# Altium footprint library Sajad_Altium_Library.PcbLib: 333 footprints (part 21 of 21)
Each footprint in its own frame and in the unit in brackets; x right, y up, seen from the top. Pads: shape width x height; smd on the part's side, far side on the other; paste and mask are expansions set on the pad; w line width, h text height; cw(c..) or ccw(c..) is an arc to the next point about the centre after c.
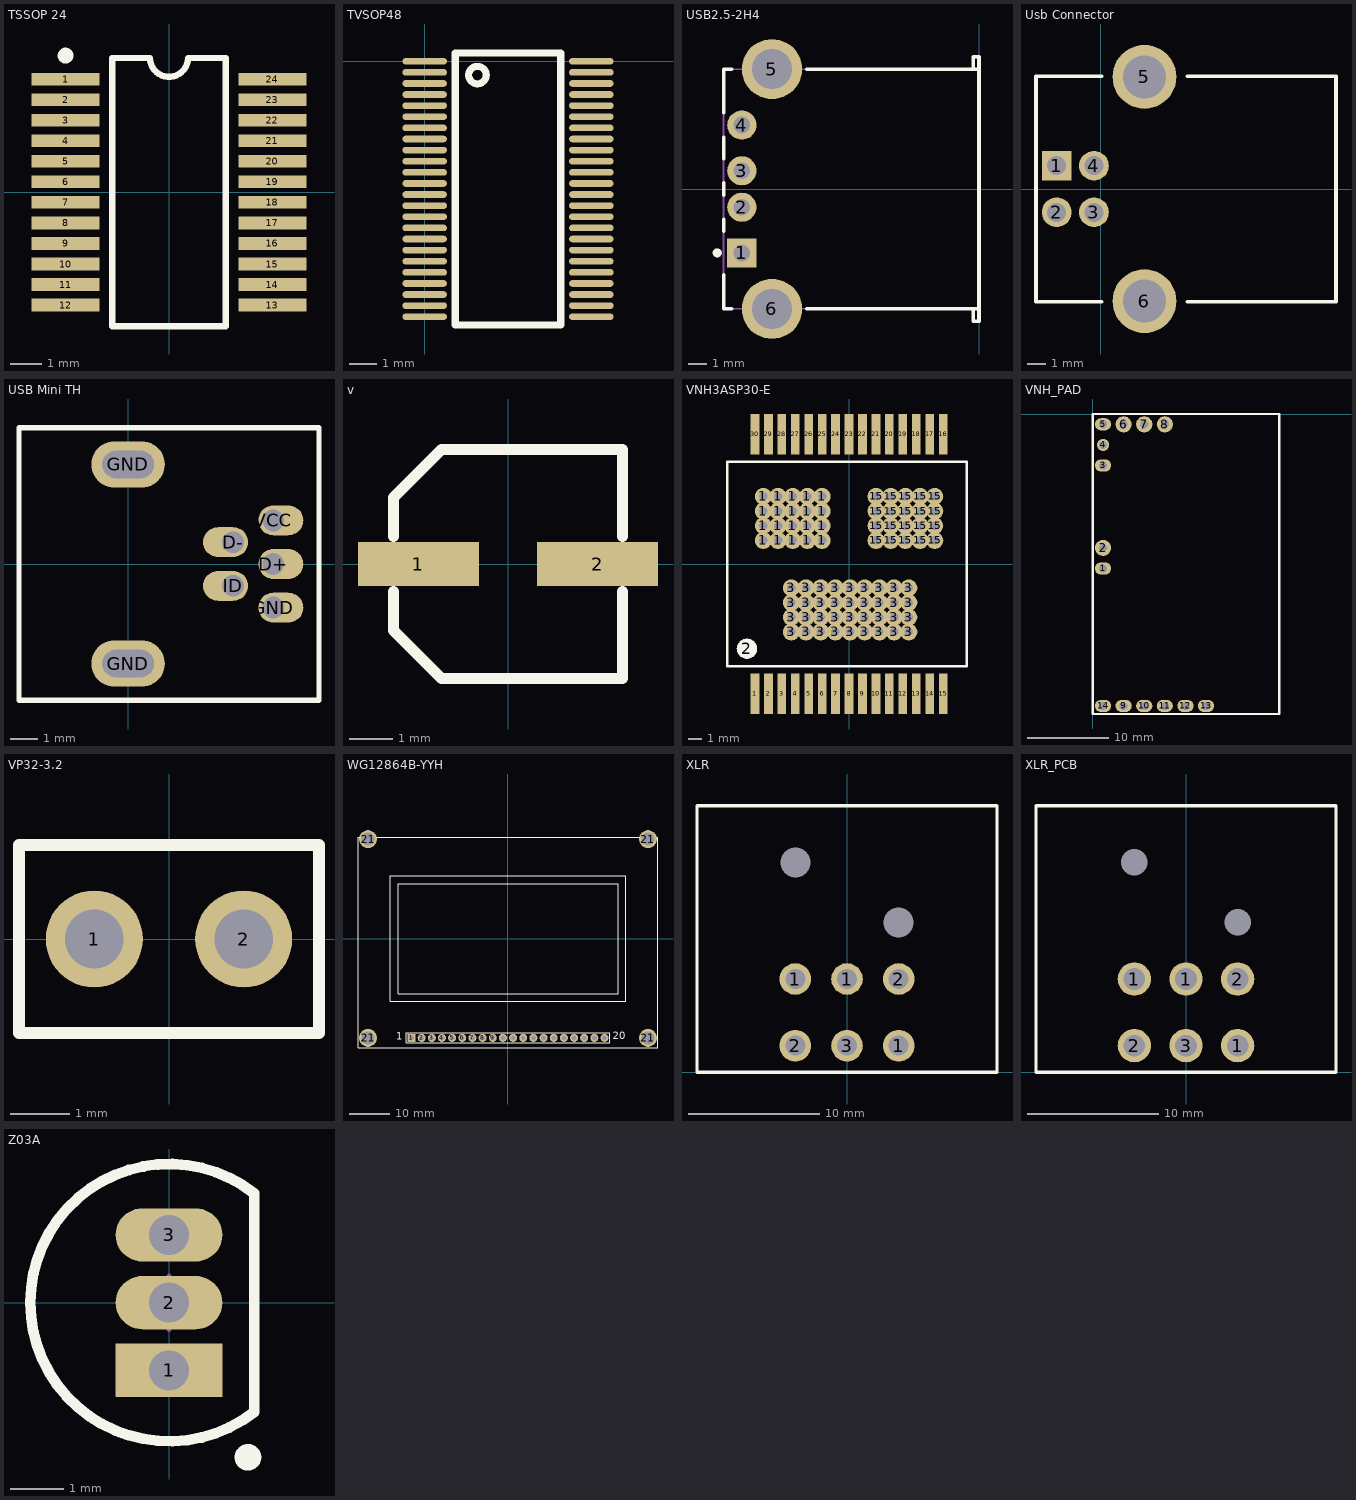
[diagram p20: the footprints below, top view; thin cyan lines are the x and y axes]

## TSSOP 24 [mm] "SSOP, Plastic; 24 Leads; Body Width 5.3 mm; Pitch 0.65 mm"
height 2
pads (24):
  rect 2.15x0.4 smd: 1(-3.275,3.575) 2(-3.275,2.925) 3(-3.275,2.275) 4(-3.275,1.625) 5(-3.275,0.975) 6(-3.275,0.325) 7(-3.275,-0.325) 8(-3.275,-0.975) 9(-3.275,-1.625) 10(-3.275,-2.275) 11(-3.275,-2.925) 12(-3.275,-3.575) 13(3.275,-3.575) 14(3.275,-2.925) 15(3.275,-2.275) 16(3.275,-1.625) 17(3.275,-0.975) 18(3.275,-0.325) 19(3.275,0.325) 20(3.275,0.975) 21(3.275,1.625) 22(3.275,2.275) 23(3.275,2.925) 24(3.275,3.575)
Top Overlay:
  circle w0.25: c-3.275,4.325 r0.125
  lines w0.2: -1.8,-4.25 1.8,-4.25 1.8,4.25 0.6,4.25 cw(c0,4.25) -0.6,4.25 -1.8,4.25 -1.8,-4.25
3D body: height 1.1, standoff 0, extent -3.2,-3.95 3.2,3.95

## TVSOP48 [mm]
pads (48):
  oval 1.6x0.24 smd: 1(0,0) 2(0,-0.4) 3(0,-0.8) 4(0,-1.2) 5(0,-1.6) 6(0,-2) 7(0,-2.4) 8(0,-2.8) 9(0,-3.2) 10(0,-3.6) 11(0,-4) 12(0,-4.4) 13(0,-4.8) 14(0,-5.2) 15(0,-5.6) 16(0,-6) 17(0,-6.4) 18(0,-6.8) 19(0,-7.2) 20(0,-7.6) 21(0,-8) 22(0,-8.4) 23(0,-8.8) 24(0,-9.2) 25(6,-9.2) 26(6,-8.8) 27(6,-8.4) 28(6,-8) 29(6,-7.6) 30(6,-7.2) 31(6,-6.8) 32(6,-6.4) 33(6,-6) 34(6,-5.6) 35(6,-5.2) 36(6,-4.8) 37(6,-4.4) 38(6,-4) 39(6,-3.6) 40(6,-3.2) 41(6,-2.8) 42(6,-2.4) 43(6,-2) 44(6,-1.6) 45(6,-1.2) 46(6,-0.8) 47(6,-0.4) 48(6,0)
Top Overlay:
  circle w0.254: c1.9,-0.5 r0.316
  lines w0.254: 1.1,-9.5 1.1,0.3 4.9,0.3 4.9,-9.5 1.1,-9.5

## USB2.5-2H4 [mm] "Connector; USB1.1, Series A, Reverse Type, Thru-Hole; 4 Position; Right Angle"
height 6.5
pads (6):
  rect 1.6x1.6 hole 0.92: 1(-13,-3.5)
  round 1.6 hole 0.92: 2(-13,-1) 3(-13,1) 4(-13,3.5)
  round 3.3 hole 2.2: 5(-11.348,6.57) 6(-11.348,-6.57)
Top Overlay:
  circle w0.25: c-14.35,-3.5 r0.125
  lines w0.2: -14,-4.7 -14,-6.565 -13.55,-6.565 ; -14,-2.3 -14,-1.67 ; -14,-0.33 -14,0.33 ; -14,1.67 -14,2.83 ; -14,4.17 -14,6.565 -13.55,6.565 ; -9.45,-6.565 0,-6.565 ; -9.45,6.565 0,6.565 ; -0.32,-6.565 -0.32,-7.25 0,-7.25 0,7.25 -0.32,7.25 -0.32,6.565
Mechanical 1:
  lines w0.1: 0,-7.25 0,7.25
  text "PCB Edge" at -0.336,-6.303 h0.25
Mechanical 13:
  lines w0.1: -14,-6.565 -14,6.565 -0.32,6.565 -0.32,7.25 0,7.25 0,-7.25 -0.32,-7.25 -0.32,-6.565 -14,-6.565
3D body: height 6.95, standoff -4.2, extent -14.235,-7.9 -0.535,7.9

## Usb Connector [mm] "Usb Connector"
pads (6):
  rect 1.6x1.6 hole 1.016: 1(-2.355,1.25)
  round 1.6 hole 1.016: 2(-2.355,-1.25) 3(-0.355,-1.25) 4(-0.355,1.25)
  round 3.429 hole 2.3: 5(2.355,6.02) 6(2.355,-6.02)
Top Overlay:
  lines w0.2: 0.055,-6.05 -3.465,-6.05 -3.465,6.05 0.055,6.05 ; 4.655,-6.05 12.635,-6.05 12.635,6.05 4.655,6.05
3D body: height 11.5, standoff -3.14, extent -3.868,-7.399 12.632,7.397

## USB Mini TH [mm] "USB Mini MOLEX 548190519"
height 4
pads (7):
  oval 1.65x1.1 hole 0.8 copper offset 0.275,0: D+(5.325,0) GND(5.325,-1.6) VCC(5.325,1.6)
  oval 1.65x1.1 hole 0.8 copper offset -0.275,0: D-(3.85,0.8) ID(3.85,-0.8)
  oval 2.7x1.7 hole 1 slot 1.9 at 0 deg: GND(0,-3.65) GND(0,3.65)
Top Overlay:
  lines w0.2: -4,-5 7,-5 7,5 -4,5 -4,-5
3D body: height 4, standoff -1.75, extent -3.6,-3.85 5.4,3.85

## v [mm] "5 x 5.5mm Smd Capacitor"
pads (2):
  rect 2.8x1.016 smd: 1(-2.073,0) 2(2.073,0)
Top Overlay:
  lines w0.254: -2.65,-0.635 -2.65,-1.541 -1.541,-2.65 2.65,-2.65 2.65,-0.635 ; -2.65,0.635 -2.65,1.541 -1.541,2.65 2.65,2.65 2.65,0.635
3D body: height 5.41, standoff 0, extent -2.95,-2.65 2.95,2.65

## VNH3ASP30-E [mil]
pads (107):
  rect 25.59x118.11 smd: 1(-275.59,-380.24) 2(-236.22,-380.24) 3(-196.85,-380.24) 4(-157.48,-380.24) 5(-118.11,-380.24) 6(-78.74,-380.24) 7(-39.37,-380.24) 8(0,-380.24) 9(39.37,-380.24) 10(78.74,-380.24) 11(118.11,-380.24) 12(157.48,-380.24) 13(196.85,-380.24) 14(236.22,-380.24) 15(275.59,-380.24) 16(275.59,380.24) 17(236.22,380.24) 18(196.85,380.24) 19(157.48,380.24) 20(118.11,380.24) 21(78.74,380.24) 22(39.37,380.24) 23(0,380.24) 24(-39.37,380.24) 25(-78.74,380.24) 26(-118.11,380.24) 27(-157.48,380.24) 28(-196.85,380.24) 29(-236.22,380.24) 30(-275.59,380.24)
  round 50 hole 25: 1(-251,69) 1(-251,112) 1(-251,155) 1(-251,198) 1(-208,69) 1(-208,112) 1(-208,155) 1(-208,198) 1(-165,69) 1(-165,112) 1(-165,155) 1(-165,198) 1(-122,69) 1(-122,112) 1(-122,155) 1(-122,198) 1(-79,69) 1(-79,112) 1(-79,155) 1(-79,198) 3(-169,-199) 3(-169,-156) 3(-169,-113) 3(-169,-70) 3(-126,-199) 3(-126,-156) 3(-126,-113) 3(-126,-70) 3(-83,-199) 3(-83,-156) 3(-83,-113) 3(-83,-70) 3(-40,-199) 3(-40,-156) 3(-40,-113) 3(-40,-70) 3(3,-199) 3(3,-156) 3(3,-113) 3(3,-70) 3(46,-199) 3(46,-156) 3(46,-113) 3(46,-70) 3(89,-199) 3(89,-156) 3(89,-113) 3(89,-70) 3(132,-199) 3(132,-156) 3(132,-113) 3(132,-70) 3(175,-199) 3(175,-156) 3(175,-113) 3(175,-70) 15(79,69) 15(79,112) 15(79,155) 15(79,198) 15(122,69) 15(122,112) 15(122,155) 15(122,198) 15(165,69) 15(165,112) 15(165,155) 15(165,198) 15(208,69) 15(208,112) 15(208,155) 15(208,198) 15(251,69) 15(251,112) 15(251,155) 15(251,198)
  round 60 on Top Overlay: 2(-299,-248)
Top Overlay:
  lines w7.87: -356.45,-299.8 -356.45,299.8 ; -355.98,-299.8 344.49,-299.8 344.49,299.8 -355.98,299.8
Multi-Layer:
  rectangle: -288,29 -43,236
  region: 288,236 43,236 43,29 288,29
  rectangle: -203,-237 203,-30
3D body: height 93.41, standoff -3.69, extent -339.33,-374.02 337.84,374.02

## VNH_PAD [mm]
pads (14):
  oval 2x1.5 hole 1: 1(1.27,-19.05) 3(1.27,-6.35) 5(1.27,-1.27) 9(3.81,-36) 10(6.35,-36) 11(8.89,-36) 12(11.43,-36) 13(13.97,-36) 14(1.27,-36)
  round 2 hole 1: 2(1.27,-16.51) 6(3.81,-1.27) 7(6.35,-1.27) 8(8.89,-1.27)
  round 1.5 hole 1: 4(1.27,-3.81)
Top Overlay:
  lines w0.254: 0,-37 23,-37 23,0 0,0 0,-37

## VP32-3.2 [mm] "Capacitor, Ceramic, Thru-Hole, Dipped Radial; Body 5.1 x 3.2 mm (WxT) Pin Spacing 2.54 mm (typ)"
height 6
pads (2):
  round 1.65 hole 1: 1(-1.27,0) 2(1.27,0)
Top Overlay:
  lines w0.2: -2.55,-1.6 2.55,-1.6 2.55,1.6 -2.55,1.6 -2.55,-1.6
3D body: height 6.12, standoff -1.8, extent -2.917,-0.848 2.921,0.848

## WG12864B-YYH [mm] "Lcd Module"
pads (24):
  rect 2x2 hole 1.2: 1(-24.13,-24.85)
  round 2 hole 1.2: 2(-21.59,-24.85) 3(-19.05,-24.85) 4(-16.51,-24.85) 5(-13.97,-24.85) 6(-11.43,-24.85) 7(-8.89,-24.85) 8(-6.35,-24.85) 9(-3.81,-24.85) 10(-1.27,-24.85) 11(1.27,-24.85) 12(3.81,-24.85) 13(6.35,-24.85) 14(8.89,-24.85) 15(11.43,-24.85) 16(13.97,-24.85) 17(16.51,-24.85) 18(19.05,-24.85) 19(21.59,-24.85) 20(24.13,-24.85)
  round 4.5 hole 3.2: 21(-35,-24.85) 21(-35,24.85) 21(35,24.85) 21(35,-24.85)
Top Overlay:
  lines w0.2: 15.24,-26.12 -25.4,-26.12 -25.4,-23.58 -23.495,-23.58 15.24,-23.58 ; 25.4,-26.12 25.4,-23.58 ; -37.5,-27.35 -37.5,25.35 37.5,25.35 37.5,-27.35 -37.5,-27.35
  lines w0.203: 15.24,-26.12 25.4,-26.12 ; 15.24,-23.58 25.4,-23.58 15.24,-23.58
  lines w0.254: -29.4,-15.7 -29.4,15.7 29.4,15.7 29.4,-15.7 -29.4,-15.7 ; -27.5,-13.75 27.5,-13.75 27.5,13.75 -27.5,13.75 -27.5,-13.75
  text "1" at -27.915,-25.917 h3.05
  text "20" at 26.238,-25.79 h3.05

## XLR [mil]
pads (8):
  round 0 hole 90: 0(-155,630) 0(155,450)
  round 95 hole 60: 1(-155,280) 1(0,280) 1(155,80) 2(-155,80) 2(155,280) 3(0,80)
Top Overlay:
  lines w10: -450,0 -450,800 450,800 450,0 -450,0
3D body: height 922.13, standoff -152.68, extent -492.12,30 492.12,1218.98

## XLR_PCB [mil]
pads (8):
  round 0 hole 80: 0(-155,630) 0(155,450)
  round 100 hole 65: 1(-155,280) 1(0,280) 1(155,80) 2(-155,80) 2(155,280) 3(0,80)
Top Overlay:
  lines w10: -450,0 450,0 450,800 -450,800 -450,0
3D body: height 1143.27, standoff -145.96, extent -492.12,-25 492.12,1000.59

## Z03A [mm] "TO, Flat Index; 3 In-Line, Axial Leads; Body Dia. 5mm; Leads 0.55 x 0.50 mm (max)"
height 5.2
pads (3):
  rect 2x1 hole 0.75: 1(0,-1.27)
  oval 2x1 hole 0.75: 2(0,0) 3(0,1.27)
Top Overlay:
  circle w0.25: c1.48,-2.9 r0.125
  lines w0.2: 1.601,-2.049 cw(c0,0) 1.601,2.049 1.6,-2.049
Mechanical 13:
  lines w0.1: 1.601,-2.049 cw(c0,0) 1.601,2.049 1.6,-2.049
Mechanical 15:
  lines w0.1: -0.5,0 0.5,0 ; 0,-0.5 0,0.5
3D body: height 5.2, standoff 0, extent -2.612,-2.612 1.6,2.612